# Altium footprint library kalios.PcbLib: 404 footprints (part 1 of 26)
Each footprint in its own frame and in the unit in brackets; x right, y up, seen from the top. Pads: shape width x height; smd on the part's side, far side on the other; paste and mask are expansions set on the pad; w line width, h text height; cw(c..) or ccw(c..) is an arc to the next point about the centre after c.
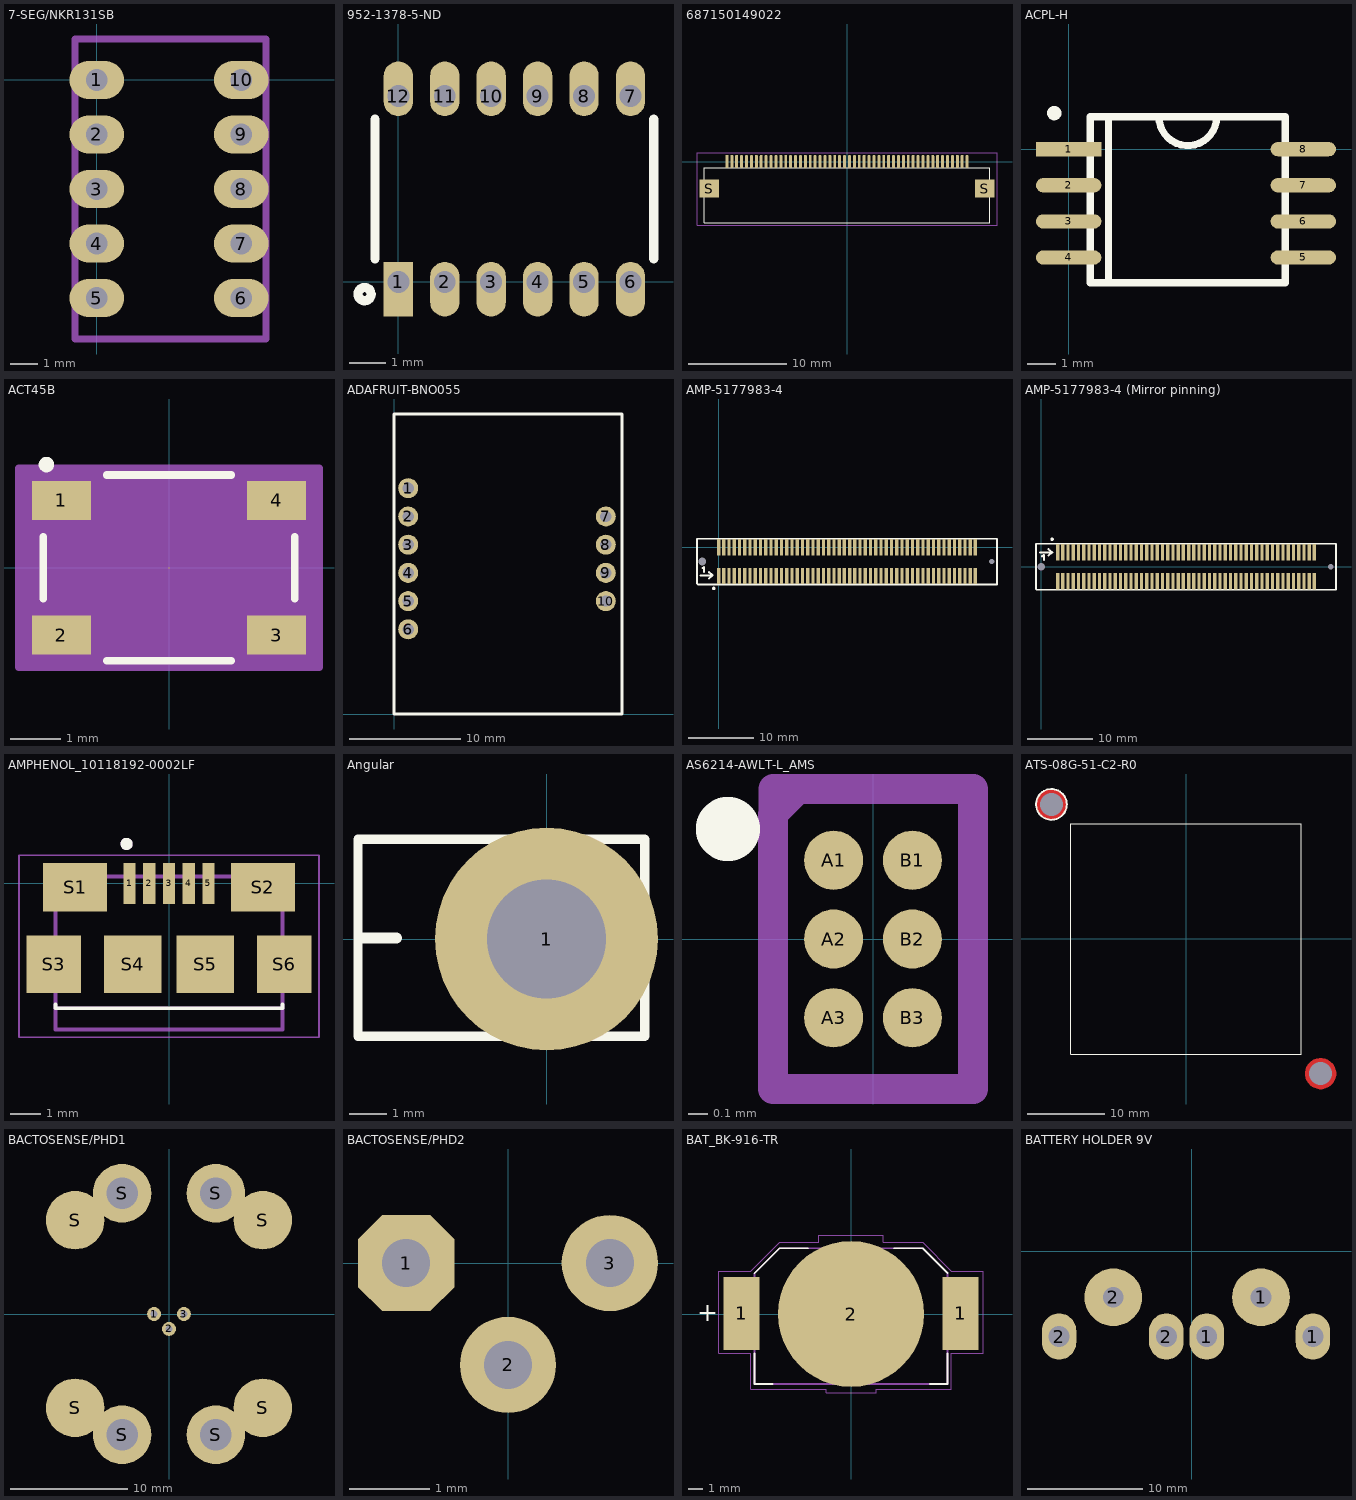
[diagram p0: the footprints below, top view; thin cyan lines are the x and y axes]

## 7-SEG/NKR131SB [mm]
pads (10):
  oval 2x1.4 hole 0.8: 1(0,0) 2(0,-2) 3(0,-4) 4(0,-6) 5(0,-8) 6(5.3,-8) 7(5.3,-6) 8(5.3,-4) 9(5.3,-2) 10(5.3,0)
Top Courtyard:
  lines w0.254: -0.8,-9.5 6.2,-9.5 6.2,1.5 -0.8,1.5 -0.8,-9.5
Top Designator:
  text ".Designator" at -0.899,1.967 h0.7
3D body "NKR131SB.STEP": height 5, standoff -4, extent -0.782,-9.513 6.218,1.487

## 952-1378-5-ND [mm]
height 5
pads (12):
  rect 0.8x1.5 hole 0.6 copper offset 0,-0.2: 1(0,0)
  oval 0.8x1.5 hole 0.6 copper offset 0,-0.2: 2(1.27,0) 3(2.54,0) 4(3.81,0) 5(5.08,0) 6(6.35,0)
  oval 0.8x1.5 hole 0.6 copper offset 0,0.2: 7(6.35,5.08) 8(5.08,5.08) 9(3.81,5.08) 10(2.54,5.08) 11(1.27,5.08) 12(0,5.08)
Top Overlay:
  lines w0.254: -0.762,-0.254 ccw(c-0.923,-0.334) -0.743,-0.334 ; -0.635,0.635 -0.635,4.445 ; 6.985,0.635 6.985,4.445
Top Designator:
  text ".Designator" at -4.676,2.032 h1.52
3D body "952-1378-5-ND.STEP": height 3.53, standoff -2.32, extent -0.635,-0.025 6.985,5.105

## 687150149022 [mm]
pads (52):
  rect 0.3x1.3 smd: 1(-12.25,0)
  rrect50% 0.3x1.3 smd: 2(-11.75,0) 3(-11.25,0) 4(-10.75,0) 5(-10.25,0) 6(-9.75,0) 7(-9.25,0) 8(-8.75,0) 9(-8.25,0) 10(-7.75,0) 11(-7.25,0) 12(-6.75,0) 13(-6.25,0) 14(-5.75,0) 15(-5.25,0) 16(-4.75,0) 17(-4.25,0) 18(-3.75,0) 19(-3.25,0) 20(-2.75,0) 21(-2.25,0) 22(-1.75,0) 23(-1.25,0) 24(-0.75,0) 25(-0.25,0) 26(0.25,0) 27(0.75,0) 28(1.25,0) 29(1.75,0) 30(2.25,0) 31(2.75,0) 32(3.25,0) 33(3.75,0) 34(4.25,0) 35(4.75,0) 36(5.25,0) 37(5.75,0) 38(6.25,0) 39(6.75,0) 40(7.25,0) 41(7.75,0) 42(8.25,0) 43(8.75,0) 44(9.25,0) 45(9.75,0) 46(10.25,0) 47(10.75,0) 48(11.25,0) 49(11.75,0) 50(12.25,0)
  rect 2x1.8 smd: S(-14.05,-2.75) S(14.05,-2.75)
Top Overlay:
  lines w0.127: -14.55,-6.25 14.55,-6.25 14.55,-0.65 -14.55,-0.65 -14.55,-6.25
Top Courtyard:
  lines w0.127: -15.3,-6.5 15.3,-6.5 15.3,0.9 -15.3,0.9 -15.3,-6.5
3D body "687150149022.stp": height 2.22, standoff -0.03, extent -14.55,-6.217 14.55,0.283

## ACPL-H [mm]
pads (8):
  rect 2.3x0.5 smd: 1(0,0)
  oval 2.3x0.5 smd: 2(0,-1.27) 3(0,-2.54) 4(0,-3.81) 5(8.255,-3.81) 6(8.255,-2.54) 7(8.255,-1.27) 8(8.255,0)
Top Overlay:
  circle w0.254: c-0.508,1.27 r0.127
  lines w0.254: 1.397,-4.699 1.397,1.143 ; 3.175,1.143 ccw(c4.191,1.143) 5.207,1.143 ; 0.762,-4.699 7.62,-4.699 7.62,1.143 0.762,1.143 0.762,-4.699
Top Designator:
  text ".Designator" at -3.49,-2.226 h1.52
3D body "ACPL-H312.STEP": height 2.98, standoff 0, extent -0.835,-4.961 9.115,1.143

## ACT45B [mm] "COMMON MODE CHOKE"
pads (4):
  rect 1.163x0.762 smd paste+0 mask+0: 1(-2.118,1.325) 2(-2.118,-1.325) 3(2.118,-1.325) 4(2.118,1.325)
Top Overlay:
  circle w0.152: c-2.413,2.032 r0.076
  lines w0.152: -2.476,-0.611 -2.476,0.611 ; -1.227,-1.829 1.227,-1.829 ; -1.227,1.829 1.227,1.829 ; 2.476,-0.611 2.476,0.611
Top 3D Body:
  circle w0: c-1.991,1.325 r0.076
Top Courtyard:
  region: 2.953,-1.96 -2.953,-1.96 -2.953,1.96 2.953,1.96
  lines w0.152: -2.953,-1.96 2.953,-1.96 2.953,1.96 -2.953,1.96 -2.953,-1.96
Top Designator:
  text ".Designator" at -7.618,-0.434 h1.52
3D body "act45b.STEP": height 3, standoff 0, extent -2.25,-1.6 2.25,1.6

## ADAFRUIT-BNO055 [mm]
pads (10):
  round 1.8 hole 1: 1(1.27,20.32) 2(1.27,17.78) 3(1.27,15.24) 4(1.27,12.7) 5(1.27,10.16) 6(1.27,7.62) 7(19.05,17.78) 8(19.05,15.24) 9(19.05,12.7) 10(19.05,10.16)
Top Overlay:
  lines w0.254: 0,0 20.5,0 20.5,27 0,27 0,0
Top Designator:
  text ".Designator" at 2.632,12.992 h1.52
3D body "Assem1.STEP": height 4.17, standoff 0.09, extent -0.025,0.013 20.475,27.013

## AMP-5177983-4 [mm] "Connector board to board F 0.8mm pitch 100pin"
height 13
pads (102):
  round 0 hole 0.8 unplated: 0(41.7,-2.2)
  rect 0.5x2.5 smd: 1(0,-4.4) 2(0,0) 3(0.8,-4.4) 4(0.8,0) 5(1.6,-4.4) 6(1.6,0) 7(2.4,-4.4) 8(2.4,0) 9(3.2,-4.4) 10(3.2,0) 11(4,-4.4) 12(4,0) 13(4.8,-4.4) 14(4.8,0) 15(5.6,-4.4) 16(5.6,0) 17(6.4,-4.4) 18(6.4,0) 19(7.2,-4.4) 20(7.2,0) 21(8,-4.4) 22(8,0) 23(8.8,-4.4) 24(8.8,0) 25(9.6,-4.4) 26(9.6,0) 27(10.4,-4.4) 28(10.4,0) 29(11.2,-4.4) 30(11.2,0) 31(12,-4.4) 32(12,0) 33(12.8,-4.4) 34(12.8,0) 35(13.6,-4.4) 36(13.6,0) 37(14.4,-4.4) 38(14.4,0) 39(15.2,-4.4) 40(15.2,0) 41(16,-4.4) 42(16,0) 43(16.8,-4.4) 44(16.8,0) 45(17.6,-4.4) 46(17.6,0) 47(18.4,-4.4) 48(18.4,0) 49(19.2,-4.4) 50(19.2,0) 51(20,-4.4) 52(20,0) 53(20.8,-4.4) 54(20.8,0) 55(21.6,-4.4) 56(21.6,0) 57(22.4,-4.4) 58(22.4,0) 59(23.2,-4.4) 60(23.2,0) 61(24,-4.4) 62(24,0) 63(24.8,-4.4) 64(24.8,0) 65(25.6,-4.4) 66(25.6,0) 67(26.4,-4.4) 68(26.4,0) 69(27.2,-4.4) 70(27.2,0) 71(28,-4.4) 72(28,0) 73(28.8,-4.4) 74(28.8,0) 75(29.6,-4.4) 76(29.6,0) 77(30.4,-4.4) 78(30.4,0) 79(31.2,-4.4) 80(31.2,0) 81(32,-4.4) 82(32,0) 83(32.8,-4.4) 84(32.8,0) 85(33.6,-4.4) 86(33.6,0) 87(34.4,-4.4) 88(34.4,0) 89(35.2,-4.4) 90(35.2,0) 91(36,-4.4) 92(36,0) 93(36.8,-4.4) 94(36.8,0) 95(37.6,-4.4) 96(37.6,0) 97(38.4,-4.4) 98(38.4,0) 99(39.2,-4.4) 100(39.2,0)
  round 0 hole 1.2 unplated: S(-2.5,-2.2)
Top Overlay:
  circle w0.254: c-0.741,-6.3 r0.141
  lines w0.254: 42.5,-5.7 42.175,-5.7 41.525,-5.7 -1.8,-5.7 -3.2,-5.7 -3.3,-5.6 -3.3,-4.2 -3.3,1.3 42.5,1.3 42.5,-4.4 42.5,-5.7 ; 42.5,-5.7 42.5,-5.7
  lines w0.3: -2.8,-4.3 -0.9,-4.3 ; -2.5,-3.2 -2.2,-3 -2.2,-3.8 ; -1.5,-4.8 -0.9,-4.3 ; -0.9,-4.3 -1.5,-3.8 -0.9,-4.3
Top Designator:
  text ".Designator" at 11.982,-3.079 h1.52
3D body "5177983-04.STEP": height 3.7, standoff -0.85, extent -3.287,-5.175 42.513,0.825

## AMP-5177983-4 (Mirror pinning) [mm] "Connector board to board F 0.8mm pitch 100pin"
height 13
pads (102):
  round 0 hole 0.8 unplated: 0(44.2,0)
  rect 0.5x2.5 smd: 1(2.5,2.2) 2(2.5,-2.2) 3(3.3,2.2) 4(3.3,-2.2) 5(4.1,2.2) 6(4.1,-2.2) 7(4.9,2.2) 8(4.9,-2.2) 9(5.7,2.2) 10(5.7,-2.2) 11(6.5,2.2) 12(6.5,-2.2) 13(7.3,2.2) 14(7.3,-2.2) 15(8.1,2.2) 16(8.1,-2.2) 17(8.9,2.2) 18(8.9,-2.2) 19(9.7,2.2) 20(9.7,-2.2) 21(10.5,2.2) 22(10.5,-2.2) 23(11.3,2.2) 24(11.3,-2.2) 25(12.1,2.2) 26(12.1,-2.2) 27(12.9,2.2) 28(12.9,-2.2) 29(13.7,2.2) 30(13.7,-2.2) 31(14.5,2.2) 32(14.5,-2.2) 33(15.3,2.2) 34(15.3,-2.2) 35(16.1,2.2) 36(16.1,-2.2) 37(16.9,2.2) 38(16.9,-2.2) 39(17.7,2.2) 40(17.7,-2.2) 41(18.5,2.2) 42(18.5,-2.2) 43(19.3,2.2) 44(19.3,-2.2) 45(20.1,2.2) 46(20.1,-2.2) 47(20.9,2.2) 48(20.9,-2.2) 49(21.7,2.2) 50(21.7,-2.2) 51(22.5,2.2) 52(22.5,-2.2) 53(23.3,2.2) 54(23.3,-2.2) 55(24.1,2.2) 56(24.1,-2.2) 57(24.9,2.2) 58(24.9,-2.2) 59(25.7,2.2) 60(25.7,-2.2) 61(26.5,2.2) 62(26.5,-2.2) 63(27.3,2.2) 64(27.3,-2.2) 65(28.1,2.2) 66(28.1,-2.2) 67(28.9,2.2) 68(28.9,-2.2) 69(29.7,2.2) 70(29.7,-2.2) 71(30.5,2.2) 72(30.5,-2.2) 73(31.3,2.2) 74(31.3,-2.2) 75(32.1,2.2) 76(32.1,-2.2) 77(32.9,2.2) 78(32.9,-2.2) 79(33.7,2.2) 80(33.7,-2.2) 81(34.5,2.2) 82(34.5,-2.2) 83(35.3,2.2) 84(35.3,-2.2) 85(36.1,2.2) 86(36.1,-2.2) 87(36.9,2.2) 88(36.9,-2.2) 89(37.7,2.2) 90(37.7,-2.2) 91(38.5,2.2) 92(38.5,-2.2) 93(39.3,2.2) 94(39.3,-2.2) 95(40.1,2.2) 96(40.1,-2.2) 97(40.9,2.2) 98(40.9,-2.2) 99(41.7,2.2) 100(41.7,-2.2)
  round 0 hole 1.2 unplated: S(0,0)
Top Overlay:
  circle w0.254: c1.659,4.2 r0.141
  lines w0.254: 45,-3.5 44.675,-3.5 44.025,-3.5 0.7,-3.5 -0.7,-3.5 -0.8,-3.4 -0.8,-2 -0.8,3.5 45,3.5 45,-2.2 45,-3.5 ; 45,-3.5 45,-3.5
  lines w0.3: -0.2,2.2 1.7,2.2 ; 0.1,1.6 0.4,1.8 0.4,1 ; 1.1,1.7 1.7,2.2 ; 1.1,2.7 1.7,2.2
Top Designator:
  text ".Designator" at 14.482,-0.087 h1.52
3D body "5177983-04.STEP": height 3.7, standoff -0.85, extent -0.787,-2.975 45.013,3.025

## AMPHENOL_10118192-0002LF [mm]
pads (11):
  rect 0.4x1.35 smd: 1(-1.3,0) 2(-0.65,0) 3(0,0) 4(0.65,0) 5(1.3,0)
  rect 2.1x1.6 smd: S1(-3.1,-0.125) S2(3.1,-0.125)
  rect 1.8x1.9 smd: S3(-3.8,-2.675) S6(3.8,-2.675)
  rect 1.9x1.9 smd: S4(-1.2,-2.675) S5(1.2,-2.675)
Top Overlay:
  circle w0.2: c-1.4,1.3 r0.1
  lines w0.127: -3.75,-4 -3.75,-4.125 3.75,-4.125 3.75,-4
Top 3D Body:
  circle w0.2: c-1.4,1.3 r0.1
  lines w0.127: -3.75,-4.125 3.75,-4.125 ; -3.75,-4.125 -3.75,0.225 3.75,0.225 3.75,-4.125 ; -3.75,-4.125 -3.75,-4.825 3.75,-4.825 3.75,-4.125
Top Courtyard:
  lines w0.05: -4.95,-5.075 -4.95,0.925 4.95,0.925 4.95,-5.075 -4.95,-5.075
Top Designator:
  text ".Designator" at -7.618,-2.308 h1.52
3D body "10118192-002lfc.STEP": height 2.73, standoff -0.04, extent -3.956,-4.846 3.956,0.254

## Angular [mm]
pads (1):
  round 6 hole 3.2 unplated: 1(0,0)
Top Overlay:
  lines w0.254: -5.08,-2.616 2.642,-2.616 2.642,2.692 -5.08,2.692 -5.08,-2.616
  lines w0.3: -5.029,0.025 -4.039,0.025
Top Designator:
  text ".Designator" at -8.67,-0.508 h1.52
3D body "angle.STEP": height 14, standoff 0, extent -4.978,-2.435 2.522,2.565

## AS6214-AWLT-L_AMS [mm]
pads (6):
  round 0.3 smd paste+0: A1(-0.2,0.4) A2(-0.2,0) A3(-0.2,-0.4) B1(0.2,0.4) B2(0.2,0) B3(0.2,-0.4)
Top Overlay:
  circle w0.254: c-0.737,0.559 r0.036
Top 3D Body:
  lines w0.15: -0.508,-0.762 0.508,-0.762 0.508,0.762 -0.508,0.762 -0.508,-0.762
Top Courtyard:
  lines w0.152: -0.508,-0.762 0.508,-0.762 0.508,0.762 -0.381,0.762 -0.508,0.635 -0.508,-0.762
3D body "WLCSP-6.STEP": height 0.22, standoff -0.38, extent -0.523,-0.757 0.523,0.757

## ATS-08G-51-C2-R0 [mm]
pads (2):
  round 0 hole 3: 1(-17.5,17.5) 1(17.5,-17.5)
Top Layer:
  pour cut-out: -15.519,17.501 -15.519,17.698 -15.597,18.086 -15.748,18.451 -15.967,18.78 -16.247,19.059 -16.576,19.279 -16.941,19.43 -17.328,19.507 -17.526,19.507 -17.724,19.507 -18.111,19.43 -18.476,19.279 -18.805,19.059 -19.085,18.78 -19.304,18.451 -19.455,18.086 -19.533,17.698 -19.533,17.501 -19.533,17.303 -19.455,16.915 -19.304,16.55 -19.085,16.221 -18.805,15.942 -18.476,15.722 -18.111,15.571 -17.724,15.494 -17.526,15.494 -17.501,15.494 -17.305,15.494 -16.923,15.57 -16.562,15.719 -16.238,15.936 -15.962,16.212 -15.745,16.537 -15.596,16.897 -15.519,17.28 -15.519,17.475
  pour cut-out: 19.507,-17.526 19.507,-17.328 19.43,-16.941 19.279,-16.576 19.059,-16.247 18.78,-15.967 18.451,-15.748 18.086,-15.597 17.698,-15.519 17.501,-15.519 17.303,-15.519 16.915,-15.597 16.55,-15.748 16.221,-15.967 15.942,-16.247 15.722,-16.576 15.571,-16.941 15.494,-17.328 15.494,-17.526 15.494,-17.724 15.571,-18.111 15.722,-18.476 15.942,-18.805 16.221,-19.085 16.55,-19.304 16.915,-19.455 17.303,-19.533 17.501,-19.533 17.526,-19.533 17.721,-19.533 18.104,-19.456 18.464,-19.307 18.789,-19.09 19.065,-18.814 19.282,-18.49 19.431,-18.129 19.507,-17.747 19.507,-17.551
Top Overlay:
  circle w0.254: c-17.526,17.501 r2
  lines w0.152: -15,-15 15,-15 15,15 -15,15 -15,-15
3D body "ATS-PP-02.STEP": height 11.27, standoff -1.52, extent 14.026,-20.975 21.026,-13.975
3D body "ATS-PP-02.STEP": height 11.27, standoff -1.52, extent -20.95,13.924 -13.95,20.924
3D body "ATS-08G-51-C2-R0.STEP": height 22, standoff 2, extent -19.846,-19.897 19.846,19.795

## BACTOSENSE/PHD1 [mm]
pads (11):
  round 1.2 hole 0.6: 1(-1.27,0) 2(0,-1.27) 3(1.27,0)
  round 5 all layers, no hole: S(-8,-8) S(-8,8) S(8,-8) S(8,8)
  round 5 hole 2.7: S(-4,-10.29) S(-4,10.29) S(4,-10.29) S(4,10.29)
Top Designator:
  text ".Designator" at -7.618,-0.508 h1.52
3D body "SP02.STEP": height 6.35, standoff 0, extent -13.188,-12.421 13.188,12.573
3D body "S5971.STEP": height 3.6, standoff -2.8, extent -2.955,-2.725 2.725,2.955

## BACTOSENSE/PHD2 [mm]
pads (3):
  oct 1.2x1.2 hole 0.6: 1(-1.27,0)
  round 1.2 hole 0.6: 2(0,-1.27) 3(1.27,0)
Top Designator:
  text ".Designator" at -7.618,-0.507 h1.52
3D body "PHD+Socket.STEP": height 8.4, standoff -2.82, extent -3.175,-3.174 3.175,3.176

## BAT_BK-916-TR [mm]
pads (3):
  rect 2.5x5.1 smd: 1(-7.65,0.05) 1(7.65,0.05)
  round 10.2 smd mask+0.508: 2(0,0)
Top Overlay:
  lines w0.127: -6.75,-2.75 -6.75,-4.9 -5.5,-4.9 ; -6.75,2.85 -5,4.6 -3,4.6 ; 3,4.6 5,4.6 6.75,2.85 ; 5.5,-4.9 6.75,-4.9 6.75,-2.75
  text "+" at -10.767,-0.501 h1.27
Top 3D Body:
  lines w0.127: -6.75,-4.9 -6.75,2.85 -5,4.6 5,4.6 6.75,2.85 6.75,-4.9 -6.75,-4.9
Top Courtyard:
  lines w0.05: -9.25,-2.75 -7,-2.75 -7,-5.25 -1.75,-5.25 -1.75,-5.5 1.75,-5.5 1.75,-5.25 7,-5.25 7,-2.75 9.25,-2.75 9.25,3 7,3 5,5 2.25,5 2.25,5.5 -2.25,5.5 -2.25,5 -5,5 -7,3 -9.25,3 -9.25,-2.75
Top Designator:
  text ".Designator" at -8.491,-0.251 h1.52
3D body "User Library-CR1216.STEP": height 1.6, standoff 0, extent -6.276,-5.944 6.124,6.456
3D body "BK-916.STEP": height 3.7, standoff 0, extent -7.798,-4.952 7.802,4.648

## BATTERY HOLDER 9V [mm]
pads (6):
  oval 3x4 hole 1.8: 1(1.3,-7.4) 1(10.5,-7.4) 2(-11.5,-7.4) 2(-2.2,-7.4)
  round 5 hole 1.8: 1(6,-4) 2(-6.8,-4)
Top Designator:
  text ".Designator" at -8.079,17.233 h1.52
3D body "9V.STEP": height 17.99, standoff -2.58, extent -13.479,-8.151 12.556,44.984